# Altium footprint library IC.PCBLIB: 359 footprints (part 3 of 23) (continued)
## BGA423X24-0.65 [mm] (continued)
TopOverlay:
  lines w0.2: -2.1,-0.05 -1.1,-0.05 ; -1.5,-0.45 -1.1,-0.05 ; -1.475,0.325 -1.1,-0.05 ; 0.05,1 0.05,1.45 ; -0.65,-15.6 -0.65,0.325 -0.325,0.65 15.6,0.65 15.6,-15.6 -0.65,-15.6

## BGA424-25X25-0.5 [mil] "BGA, 424-Leads, Body 13.0x13.0mm,  Pitch 0.50mm"
height 47.24
pads (424):
  round 12 smd mask+3: A2(-216.54,236.22) A3(-196.85,236.22) A4(-177.17,236.22) A5(-157.48,236.22) A6(-137.8,236.22) A7(-118.11,236.22) A8(-98.43,236.22) A9(-78.74,236.22) A10(-59.06,236.22) A11(-39.37,236.22) A12(-19.69,236.22) A13(0,236.22) A14(19.68,236.22) A15(39.37,236.22) A16(59.06,236.22) A17(78.74,236.22) A18(98.43,236.22) A19(118.11,236.22) A20(137.8,236.22) A21(157.48,236.22) A22(177.17,236.22) A23(196.85,236.22) A24(216.54,236.22) AA1(-236.22,-157.48) AA2(-216.54,-157.48) AA3(-196.85,-157.48) AA23(196.85,-157.48) AA24(216.54,-157.48) AA25(236.22,-157.48) AB1(-236.22,-177.17) AB2(-216.54,-177.17) AB3(-196.85,-177.17) AB6(-137.8,-177.17) AB7(-118.11,-177.17) AB8(-98.43,-177.17) AB9(-78.74,-177.17) AB10(-59.06,-177.17) AB11(-39.37,-177.17) AB12(-19.69,-177.17) AB13(0,-177.17) AB14(19.68,-177.17) AB15(39.37,-177.17) AB16(59.06,-177.17) AB17(78.74,-177.17) AB18(98.43,-177.17) AB19(118.11,-177.17) AB20(137.8,-177.17) AB23(196.85,-177.17) AB24(216.54,-177.17) AB25(236.22,-177.17) AC1(-236.22,-196.85) AC2(-216.54,-196.85) AC3(-196.85,-196.85) AC4(-177.17,-196.85) AC5(-157.48,-196.85) AC6(-137.8,-196.85) AC7(-118.11,-196.85) AC8(-98.43,-196.85) AC9(-78.74,-196.85) AC10(-59.06,-196.85) AC11(-39.37,-196.85) AC12(-19.69,-196.85) AC13(0,-196.85) AC14(19.68,-196.85) AC15(39.37,-196.85) AC16(59.06,-196.85) AC17(78.74,-196.85) AC18(98.43,-196.85) AC19(118.11,-196.85) AC20(137.8,-196.85) AC21(157.48,-196.85) AC22(177.17,-196.85) AC23(196.85,-196.85) AC24(216.54,-196.85) AC25(236.22,-196.85) AD1(-236.22,-216.54) AD2(-216.54,-216.54) AD3(-196.85,-216.54) AD4(-177.17,-216.54) AD5(-157.48,-216.54) AD6(-137.8,-216.54) AD7(-118.11,-216.54) AD8(-98.43,-216.54) AD9(-78.74,-216.54) AD10(-59.06,-216.54) AD11(-39.37,-216.54) AD12(-19.69,-216.54) AD13(0,-216.54) AD14(19.68,-216.54) AD15(39.37,-216.54) AD16(59.06,-216.54) AD17(78.74,-216.54) AD18(98.43,-216.54) AD19(118.11,-216.54) AD20(137.8,-216.54) AD21(157.48,-216.54) AD22(177.17,-216.54) AD23(196.85,-216.54) AD24(216.54,-216.54) AD25(236.22,-216.54) AE2(-216.54,-236.22) AE3(-196.85,-236.22) AE4(-177.17,-236.22) AE5(-157.48,-236.22) AE6(-137.8,-236.22) AE7(-118.11,-236.22) AE8(-98.43,-236.22) AE9(-78.74,-236.22) AE10(-59.06,-236.22) AE11(-39.37,-236.22) AE12(-19.69,-236.22) AE13(0,-236.22) AE14(19.68,-236.22) AE15(39.37,-236.22) AE16(59.06,-236.22) AE17(78.74,-236.22) AE18(98.43,-236.22) AE19(118.11,-236.22) AE20(137.8,-236.22) AE21(157.48,-236.22) AE22(177.17,-236.22) AE23(196.85,-236.22) AE24(216.54,-236.22) B1(-236.22,216.54) B2(-216.54,216.54) B3(-196.85,216.54) B4(-177.17,216.54) B5(-157.48,216.54) B6(-137.8,216.54) B7(-118.11,216.54) B8(-98.43,216.54) B9(-78.74,216.54) B10(-59.06,216.54) B11(-39.37,216.54) B12(-19.69,216.54) B13(0,216.54) B14(19.68,216.54) B15(39.37,216.54) B16(59.06,216.54) B17(78.74,216.54) B18(98.43,216.54) B19(118.11,216.54) B20(137.8,216.54) B21(157.48,216.54) B22(177.17,216.54) B23(196.85,216.54) B24(216.54,216.54) B25(236.22,216.54) C1(-236.22,196.85) C2(-216.54,196.85) C3(-196.85,196.85) C4(-177.17,196.85) C5(-157.48,196.85) C6(-137.8,196.85) C7(-118.11,196.85) C8(-98.43,196.85) C9(-78.74,196.85) C10(-59.06,196.85) C11(-39.37,196.85) C12(-19.69,196.85) C13(0,196.85) C14(19.68,196.85) C15(39.37,196.85) C16(59.06,196.85) C17(78.74,196.85) C18(98.43,196.85) C19(118.11,196.85) C20(137.8,196.85) C21(157.48,196.85) C22(177.17,196.85) C23(196.85,196.85) C24(216.54,196.85) C25(236.22,196.85) D1(-236.22,177.17) D2(-216.54,177.17) D3(-196.85,177.17) D6(-137.8,177.17) D7(-118.11,177.17) D8(-98.43,177.17) D9(-78.74,177.17) D10(-59.06,177.17) D11(-39.37,177.17) D12(-19.69,177.17) D13(0,177.17) D14(19.68,177.17) D15(39.37,177.17) D16(59.06,177.17) D17(78.74,177.17) D18(98.43,177.17) D19(118.11,177.17) D20(137.8,177.17) D23(196.85,177.17) D24(216.54,177.17) D25(236.22,177.17) E1(-236.22,157.48) E2(-216.54,157.48) E3(-196.85,157.48) E23(196.85,157.48) E24(216.54,157.48) E25(236.22,157.48) F1(-236.22,137.8) F2(-216.54,137.8) F3(-196.85,137.8) F4(-177.17,137.8) F22(177.17,137.8) F23(196.85,137.8) F24(216.54,137.8) F25(236.22,137.8) G1(-236.22,118.11) G2(-216.54,118.11) G3(-196.85,118.11) G4(-177.17,118.11) G8(-98.43,118.11) G9(-78.74,118.11) G10(-59.06,118.11) G11(-39.37,118.11) G12(-19.69,118.11) G13(0,118.11) G14(19.68,118.11) G15(39.37,118.11) G16(59.06,118.11) G17(78.74,118.11) G18(98.43,118.11) G22(177.17,118.11) G23(196.85,118.11) G24(216.54,118.11) G25(236.22,118.11) H1(-236.22,98.43) H2(-216.54,98.43) H3(-196.85,98.43) H4(-177.17,98.43) H7(-118.11,98.43) H8(-98.43,98.43) H9(-78.74,98.43) H10(-59.06,98.43) H11(-39.37,98.43) H12(-19.69,98.43) H13(0,98.43) H14(19.68,98.43) H15(39.37,98.43) H16(59.06,98.43) H17(78.74,98.43) H18(98.43,98.43) H19(118.11,98.43) H22(177.17,98.43) H23(196.85,98.43) H24(216.54,98.43) H25(236.22,98.43) J1(-236.22,78.74) J2(-216.54,78.74) J3(-196.85,78.74) J4(-177.17,78.74) J7(-118.11,78.74) J8(-98.43,78.74) J11(-39.37,78.74) J12(-19.69,78.74) J13(0,78.74) J14(19.68,78.74) J15(39.37,78.74) J18(98.43,78.74) J19(118.11,78.74) J22(177.17,78.74) J23(196.85,78.74) J24(216.54,78.74) J25(236.22,78.74) K1(-236.22,59.06) K2(-216.54,59.06) K3(-196.85,59.06) K4(-177.17,59.06) K7(-118.11,59.06) K8(-98.43,59.06) K18(98.43,59.06) K19(118.11,59.06) K22(177.17,59.06) K23(196.85,59.06) K24(216.54,59.06) K25(236.22,59.06) L1(-236.22,39.37) L2(-216.54,39.37) L3(-196.85,39.37) L4(-177.17,39.37) L7(-118.11,39.37) L8(-98.43,39.37) L9(-78.74,39.37) L17(78.74,39.37) L18(98.43,39.37) L19(118.11,39.37) L22(177.17,39.37) L23(196.85,39.37) L24(216.54,39.37) L25(236.22,39.37) M1(-236.22,19.69) M2(-216.54,19.69) M3(-196.85,19.69) M4(-177.17,19.69) M7(-118.11,19.69) M8(-98.43,19.69) M9(-78.74,19.69) M17(78.74,19.69) M18(98.43,19.69) M19(118.11,19.69) M22(177.17,19.69) M23(196.85,19.69) M24(216.54,19.69) M25(236.22,19.69) N1(-236.22,0) N2(-216.54,0) N3(-196.85,0) N4(-177.17,0) N7(-118.11,0) N8(-98.43,0) N9(-78.74,0) N17(78.74,0) N18(98.43,0) N19(118.11,0) N22(177.17,0) N23(196.85,0) N24(216.54,0) N25(236.22,0) P1(-236.22,-19.68) P2(-216.54,-19.68) P3(-196.85,-19.68) P4(-177.17,-19.68) P7(-118.11,-19.68) P8(-98.43,-19.68) P9(-78.74,-19.68) P17(78.74,-19.68) P18(98.43,-19.68) P19(118.11,-19.68) P22(177.17,-19.68) P23(196.85,-19.68) P24(216.54,-19.68) P25(236.22,-19.68) R1(-236.22,-39.37) R2(-216.54,-39.37) R3(-196.85,-39.37) R4(-177.17,-39.37) R7(-118.11,-39.37) R8(-98.43,-39.37) R9(-78.74,-39.37) R17(78.74,-39.37) R18(98.43,-39.37) R19(118.11,-39.37) R22(177.17,-39.37) R23(196.85,-39.37) R24(216.54,-39.37) R25(236.22,-39.37) T1(-236.22,-59.06) T2(-216.54,-59.06) T3(-196.85,-59.06) T4(-177.17,-59.06) T7(-118.11,-59.06) T8(-98.43,-59.06) T18(98.43,-59.06) T19(118.11,-59.06) T22(177.17,-59.06) T23(196.85,-59.06) T24(216.54,-59.06) T25(236.22,-59.06) U1(-236.22,-78.74) U2(-216.54,-78.74) U3(-196.85,-78.74) U4(-177.17,-78.74) U7(-118.11,-78.74) U8(-98.43,-78.74) U11(-39.37,-78.74) U12(-19.69,-78.74) U13(0,-78.74) U14(19.68,-78.74) U15(39.37,-78.74) U18(98.43,-78.74) U19(118.11,-78.74) U22(177.17,-78.74) U23(196.85,-78.74) U24(216.54,-78.74) U25(236.22,-78.74) V1(-236.22,-98.43) V2(-216.54,-98.43) V3(-196.85,-98.43) V4(-177.17,-98.43) V7(-118.11,-98.43) V8(-98.43,-98.43) V9(-78.74,-98.43) V10(-59.06,-98.43) V11(-39.37,-98.43) V12(-19.69,-98.43) V13(0,-98.43) V14(19.68,-98.43) V15(39.37,-98.43) V16(59.06,-98.43) V17(78.74,-98.43) V18(98.43,-98.43) V19(118.11,-98.43) V22(177.17,-98.43) V23(196.85,-98.43) V24(216.54,-98.43) V25(236.22,-98.43) W1(-236.22,-118.11) W2(-216.54,-118.11) W3(-196.85,-118.11) W4(-177.17,-118.11) W8(-98.43,-118.11) W9(-78.74,-118.11) W10(-59.06,-118.11) W11(-39.37,-118.11) W12(-19.69,-118.11) W13(0,-118.11) W14(19.68,-118.11) W15(39.37,-118.11) W16(59.06,-118.11) W17(78.74,-118.11) W18(98.43,-118.11) W22(177.17,-118.11) W23(196.85,-118.11) W24(216.54,-118.11) W25(236.22,-118.11) Y1(-236.22,-137.8) Y2(-216.54,-137.8) Y3(-196.85,-137.8) Y4(-177.17,-137.8) Y22(177.17,-137.8) Y23(196.85,-137.8) Y24(216.54,-137.8) Y25(236.22,-137.8)
TopOverlay:
  circle w9.84: c-272.92,235 r4.92
  region: -216.54,255.37 -255.91,216 -255.91,255.37
  lines w7.87: -255.91,216 -216.54,255.37 ; -255.91,-255.91 -255.91,255.91 255.91,255.91 255.91,-255.91 -255.91,-255.91

## BGA484X22-1.0 [mm]
height 2.032
pads (484):
  round 0.5 smd: A1(0,0) A2(1,0) A3(2,0) A4(3,0) A5(4,0) A6(5,0) A7(6,0) A8(7,0) A9(8,0) A10(9,0) A11(10,0) A12(11,0) A13(12,0) A14(13,0) A15(14,0) A16(15,0) A17(16,0) A18(17,0) A19(18,0) A20(19,0) A21(20,0) A22(21,0) AA1(0,-20) AA2(1,-20) AA3(2,-20) AA4(3,-20) AA5(4,-20) AA6(5,-20) AA7(6,-20) AA8(7,-20) AA9(8,-20) AA10(9,-20) AA11(10,-20) AA12(11,-20) AA13(12,-20) AA14(13,-20) AA15(14,-20) AA16(15,-20) AA17(16,-20) AA18(17,-20) AA19(18,-20) AA20(19,-20) AA21(20,-20) AA22(21,-20) AB1(0,-21) AB2(1,-21) AB3(2,-21) AB4(3,-21) AB5(4,-21) AB6(5,-21) AB7(6,-21) AB8(7,-21) AB9(8,-21) AB10(9,-21) AB11(10,-21) AB12(11,-21) AB13(12,-21) AB14(13,-21) AB15(14,-21) AB16(15,-21) AB17(16,-21) AB18(17,-21) AB19(18,-21) AB20(19,-21) AB21(20,-21) AB22(21,-21) B1(0,-1) B2(1,-1) B3(2,-1) B4(3,-1) B5(4,-1) B6(5,-1) B7(6,-1) B8(7,-1) B9(8,-1) B10(9,-1) B11(10,-1) B12(11,-1) B13(12,-1) B14(13,-1) B15(14,-1) B16(15,-1) B17(16,-1) B18(17,-1) B19(18,-1) B20(19,-1) B21(20,-1) B22(21,-1) C1(0,-2) C2(1,-2) C3(2,-2) C4(3,-2) C5(4,-2) C6(5,-2) C7(6,-2) C8(7,-2) C9(8,-2) C10(9,-2) C11(10,-2) C12(11,-2) C13(12,-2) C14(13,-2) C15(14,-2) C16(15,-2) C17(16,-2) C18(17,-2) C19(18,-2) C20(19,-2) C21(20,-2) C22(21,-2) D1(0,-3) D2(1,-3) D3(2,-3) D4(3,-3) D5(4,-3) D6(5,-3) D7(6,-3) D8(7,-3) D9(8,-3) D10(9,-3) D11(10,-3) D12(11,-3) D13(12,-3) D14(13,-3) D15(14,-3) D16(15,-3) D17(16,-3) D18(17,-3) D19(18,-3) D20(19,-3) D21(20,-3) D22(21,-3) E1(0,-4) E2(1,-4) E3(2,-4) E4(3,-4) E5(4,-4) E6(5,-4) E7(6,-4) E8(7,-4) E9(8,-4) E10(9,-4) E11(10,-4) E12(11,-4) E13(12,-4) E14(13,-4) E15(14,-4) E16(15,-4) E17(16,-4) E18(17,-4) E19(18,-4) E20(19,-4) E21(20,-4) E22(21,-4) F1(0,-5) F2(1,-5) F3(2,-5) F4(3,-5) F5(4,-5) F6(5,-5) F7(6,-5) F8(7,-5) F9(8,-5) F10(9,-5) F11(10,-5) F12(11,-5) F13(12,-5) F14(13,-5) F15(14,-5) F16(15,-5) F17(16,-5) F18(17,-5) F19(18,-5) F20(19,-5) F21(20,-5) F22(21,-5) G1(0,-6) G2(1,-6) G3(2,-6) G4(3,-6) G5(4,-6) G6(5,-6) G7(6,-6) G8(7,-6) G9(8,-6) G10(9,-6) G11(10,-6) G12(11,-6) G13(12,-6) G14(13,-6) G15(14,-6) G16(15,-6) G17(16,-6) G18(17,-6) G19(18,-6) G20(19,-6) G21(20,-6) G22(21,-6) H1(0,-7) H2(1,-7) H3(2,-7) H4(3,-7) H5(4,-7) H6(5,-7) H7(6,-7) H8(7,-7) H9(8,-7) H10(9,-7) H11(10,-7) H12(11,-7) H13(12,-7) H14(13,-7) H15(14,-7) H16(15,-7) H17(16,-7) H18(17,-7) H19(18,-7) H20(19,-7) H21(20,-7) H22(21,-7) J1(0,-8) J2(1,-8) J3(2,-8) J4(3,-8) J5(4,-8) J6(5,-8) J7(6,-8) J8(7,-8) J9(8,-8) J10(9,-8) J11(10,-8) J12(11,-8) J13(12,-8) J14(13,-8) J15(14,-8) J16(15,-8) J17(16,-8) J18(17,-8) J19(18,-8) J20(19,-8) J21(20,-8) J22(21,-8) K1(0,-9) K2(1,-9) K3(2,-9) K4(3,-9) K5(4,-9) K6(5,-9) K7(6,-9) K8(7,-9) K9(8,-9) K10(9,-9) K11(10,-9) K12(11,-9) K13(12,-9) K14(13,-9) K15(14,-9) K16(15,-9) K17(16,-9) K18(17,-9) K19(18,-9) K20(19,-9) K21(20,-9) K22(21,-9) L1(0,-10) L2(1,-10) L3(2,-10) L4(3,-10) L5(4,-10) L6(5,-10) L7(6,-10) L8(7,-10) L9(8,-10) L10(9,-10) L11(10,-10) L12(11,-10) L13(12,-10) L14(13,-10) L15(14,-10) L16(15,-10) L17(16,-10) L18(17,-10) L19(18,-10) L20(19,-10) L21(20,-10) L22(21,-10) M1(0,-11) M2(1,-11) M3(2,-11) M4(3,-11) M5(4,-11) M6(5,-11) M7(6,-11) M8(7,-11) M9(8,-11) M10(9,-11) M11(10,-11) M12(11,-11) M13(12,-11) M14(13,-11) M15(14,-11) M16(15,-11) M17(16,-11) M18(17,-11) M19(18,-11) M20(19,-11) M21(20,-11) M22(21,-11) N1(0,-12) N2(1,-12) N3(2,-12) N4(3,-12) N5(4,-12) N6(5,-12) N7(6,-12) N8(7,-12) N9(8,-12) N10(9,-12) N11(10,-12) N12(11,-12) N13(12,-12) N14(13,-12) N15(14,-12) N16(15,-12) N17(16,-12) N18(17,-12) N19(18,-12) N20(19,-12) N21(20,-12) N22(21,-12) P1(0,-13) P2(1,-13) P3(2,-13) P4(3,-13) P5(4,-13) P6(5,-13) P7(6,-13) P8(7,-13) P9(8,-13) P10(9,-13) P11(10,-13) P12(11,-13) P13(12,-13) P14(13,-13) P15(14,-13) P16(15,-13) P17(16,-13) P18(17,-13) P19(18,-13) P20(19,-13) P21(20,-13) P22(21,-13) R1(0,-14) R2(1,-14) R3(2,-14) R4(3,-14) R5(4,-14) R6(5,-14) R7(6,-14) R8(7,-14) R9(8,-14) R10(9,-14) R11(10,-14) R12(11,-14) R13(12,-14) R14(13,-14) R15(14,-14) R16(15,-14) R17(16,-14) R18(17,-14) R19(18,-14) R20(19,-14) R21(20,-14) R22(21,-14) T1(0,-15) T2(1,-15) T3(2,-15) T4(3,-15) T5(4,-15) T6(5,-15) T7(6,-15) T8(7,-15) T9(8,-15) T10(9,-15) T11(10,-15) T12(11,-15) T13(12,-15) T14(13,-15) T15(14,-15) T16(15,-15) T17(16,-15) T18(17,-15) T19(18,-15) T20(19,-15) T21(20,-15) T22(21,-15) U1(0,-16) U2(1,-16) U3(2,-16) U4(3,-16) U5(4,-16) U6(5,-16) U7(6,-16) U8(7,-16) U9(8,-16) U10(9,-16) U11(10,-16) U12(11,-16) U13(12,-16) U14(13,-16) U15(14,-16) U16(15,-16) U17(16,-16) U18(17,-16) U19(18,-16) U20(19,-16) U21(20,-16) U22(21,-16) V1(0,-17) V2(1,-17) V3(2,-17) V4(3,-17) V5(4,-17) V6(5,-17) V7(6,-17) V8(7,-17) V9(8,-17) V10(9,-17) V11(10,-17) V12(11,-17) V13(12,-17) V14(13,-17) V15(14,-17) V16(15,-17) V17(16,-17) V18(17,-17) V19(18,-17) V20(19,-17) V21(20,-17) V22(21,-17) W1(0,-18) W2(1,-18) W3(2,-18) W4(3,-18) W5(4,-18) W6(5,-18) W7(6,-18) W8(7,-18) W9(8,-18) W10(9,-18) W11(10,-18) W12(11,-18) W13(12,-18) W14(13,-18) W15(14,-18) W16(15,-18) W17(16,-18) W18(17,-18) W19(18,-18) W20(19,-18) W21(20,-18) W22(21,-18) Y1(0,-19) Y2(1,-19) Y3(2,-19) Y4(3,-19) Y5(4,-19) Y6(5,-19) Y7(6,-19) Y8(7,-19) Y9(8,-19) Y10(9,-19) Y11(10,-19) Y12(11,-19) Y13(12,-19) Y14(13,-19) Y15(14,-19) Y16(15,-19) Y17(16,-19) Y18(17,-19) Y19(18,-19) Y20(19,-19) Y21(20,-19) Y22(21,-19)
TopOverlay:
  circle w0.25: c-1.65,0 r0.125
  lines w0.2: -1,0 0,1 ; -1,-22 -1,1 22,1 22,-22 -1,-22

## D2PAK [mil]
pads (3):
  rect 82x150 smd: 1(160,-660) 3(360,-660)
  rect 450x350 smd: 2(260,-210)
TopOverlay:
  lines w8: 0,-80 0,0 100,0 ; 420,0 520,0 520,-80

## DIP-4(300) [mil]
pads (4):
  rect 55x55 hole 32: 1(0,0)
  round 55 hole 32: 2(0,-100) 3(300,-100) 4(300,0)
TopOverlay:
  lines w10: 62.5,-150 237.5,-150 237.5,50 175,50 cw(c150,50) 125,50 62.5,50 62.5,-150

## DIP-4N [mil]
pads (4):
  rect 60x60 hole 35: 1(0,0)
  round 60 hole 35: 2(0,-100) 3(300,-100) 4(300,0)
TopOverlay:
  lines w10: 50,-150 50,50 125,50 ccw(c150,50) 175,50 250,50 250,-150 50,-150

## DIP-6(300) [mil]
pads (6):
  rect 55x55 hole 32: 1(0,0)
  round 55 hole 32: 2(0,-100) 3(0,-200) 4(300,-200) 5(300,-100) 6(300,0)
TopOverlay:
  lines w10: 62.5,-250 237.5,-250 237.5,50 175,50 cw(c150,50) 125,50 62.5,50 62.5,-250

## DIP-6N [mil]
pads (6):
  rect 60x60 hole 35: 1(0,0)
  round 60 hole 35: 2(0,-100) 3(0,-200) 4(300,-200) 5(300,-100) 6(300,0)
TopOverlay:
  lines w10: 50,-250 50,50 125,50 ccw(c150,50) 175,50 250,50 250,-250 50,-250

## DIP-8(300) [mil]
pads (8):
  rect 55x55 hole 32: 1(0,0)
  round 55 hole 32: 2(0,-100) 3(0,-200) 4(0,-300) 5(300,-300) 6(300,-200) 7(300,-100) 8(300,0)
TopOverlay:
  lines w10: 65,-350 65,50 125,50 ccw(c150,50) 175,50 235,50 235,-350 65,-350

## DIP-8N [mil]
pads (8):
  rect 60x60 hole 35: 1(0,0)
  round 60 hole 35: 2(0,-100) 3(0,-200) 4(0,-300) 5(300,-300) 6(300,-200) 7(300,-100) 8(300,0)
TopOverlay:
  lines w10: 50,-350 50,50 125,50 ccw(c150,50) 175,50 250,50 250,-350 50,-350

## DIP-8NS [mil]
pads (16):
  round 60 hole 35: 0(0,-700) 0(0,-600) 0(0,-500) 0(0,-400) 0(300,-700) 0(300,-600) 0(300,-500) 0(300,-400) 2(0,-100) 3(0,-200) 4(0,-300) 5(300,-300) 6(300,-200) 7(300,-100) 8(300,0)
  rect 60x60 hole 35: 1(0,0)
TopOverlay:
  circle w10: c359.38,-995 r31.5
  lines w10: 345,-965 345,-740 373.77,-740 373.77,-965 ; -137.4,-1110.24 -137.4,267.72 437.4,267.72 437.4,-1110.24 -137.4,-1110.24 ; 50,-750 50,50 110,50 ccw(c150,50) 190,50 250,50 250,-750 50,-750
  text "5" at 485,-315 h60
  text "6" at 485,-215 h60
  text "7" at 485,-115 h60
  text "4" at -210,-315 h60
  text "3" at -210,-215 h60
  text "2" at -210,-115 h60
  text "1" at -210,-15 h60
  text "8" at 485,-15 h60

## DIP-10(300) [mil]
pads (10):
  rect 55x55 hole 32: 1(0,0)
  round 55 hole 32: 2(0,-100) 3(0,-200) 4(0,-300) 5(0,-400) 6(300,-400) 7(300,-300) 8(300,-200) 9(300,-100) 10(300,0)
TopOverlay:
  lines w10: 65,-450 65,50 125,50 ccw(c150,50) 175,50 235,50 235,-450 65,-450

## DIP-12(300) [mil]
pads (12):
  rect 55x55 hole 32: 1(0,0)
  round 55 hole 32: 2(0,-100) 3(0,-200) 4(0,-300) 5(0,-400) 6(0,-500) 7(300,-500) 8(300,-400) 9(300,-300) 10(300,-200) 11(300,-100) 12(300,0)
TopOverlay:
  lines w10: 65,-550 65,50 125,50 ccw(c150,50) 175,50 235,50 235,-550 65,-550